# Altium footprint library SpaceVNX.PcbLib: 61 footprints (part 1 of 4)
Each footprint in its own frame and in the unit in brackets; x right, y up, seen from the top. Pads: shape width x height; smd on the part's side, far side on the other; paste and mask are expansions set on the pad; w line width, h text height; cw(c..) or ccw(c..) is an arc to the next point about the centre after c.
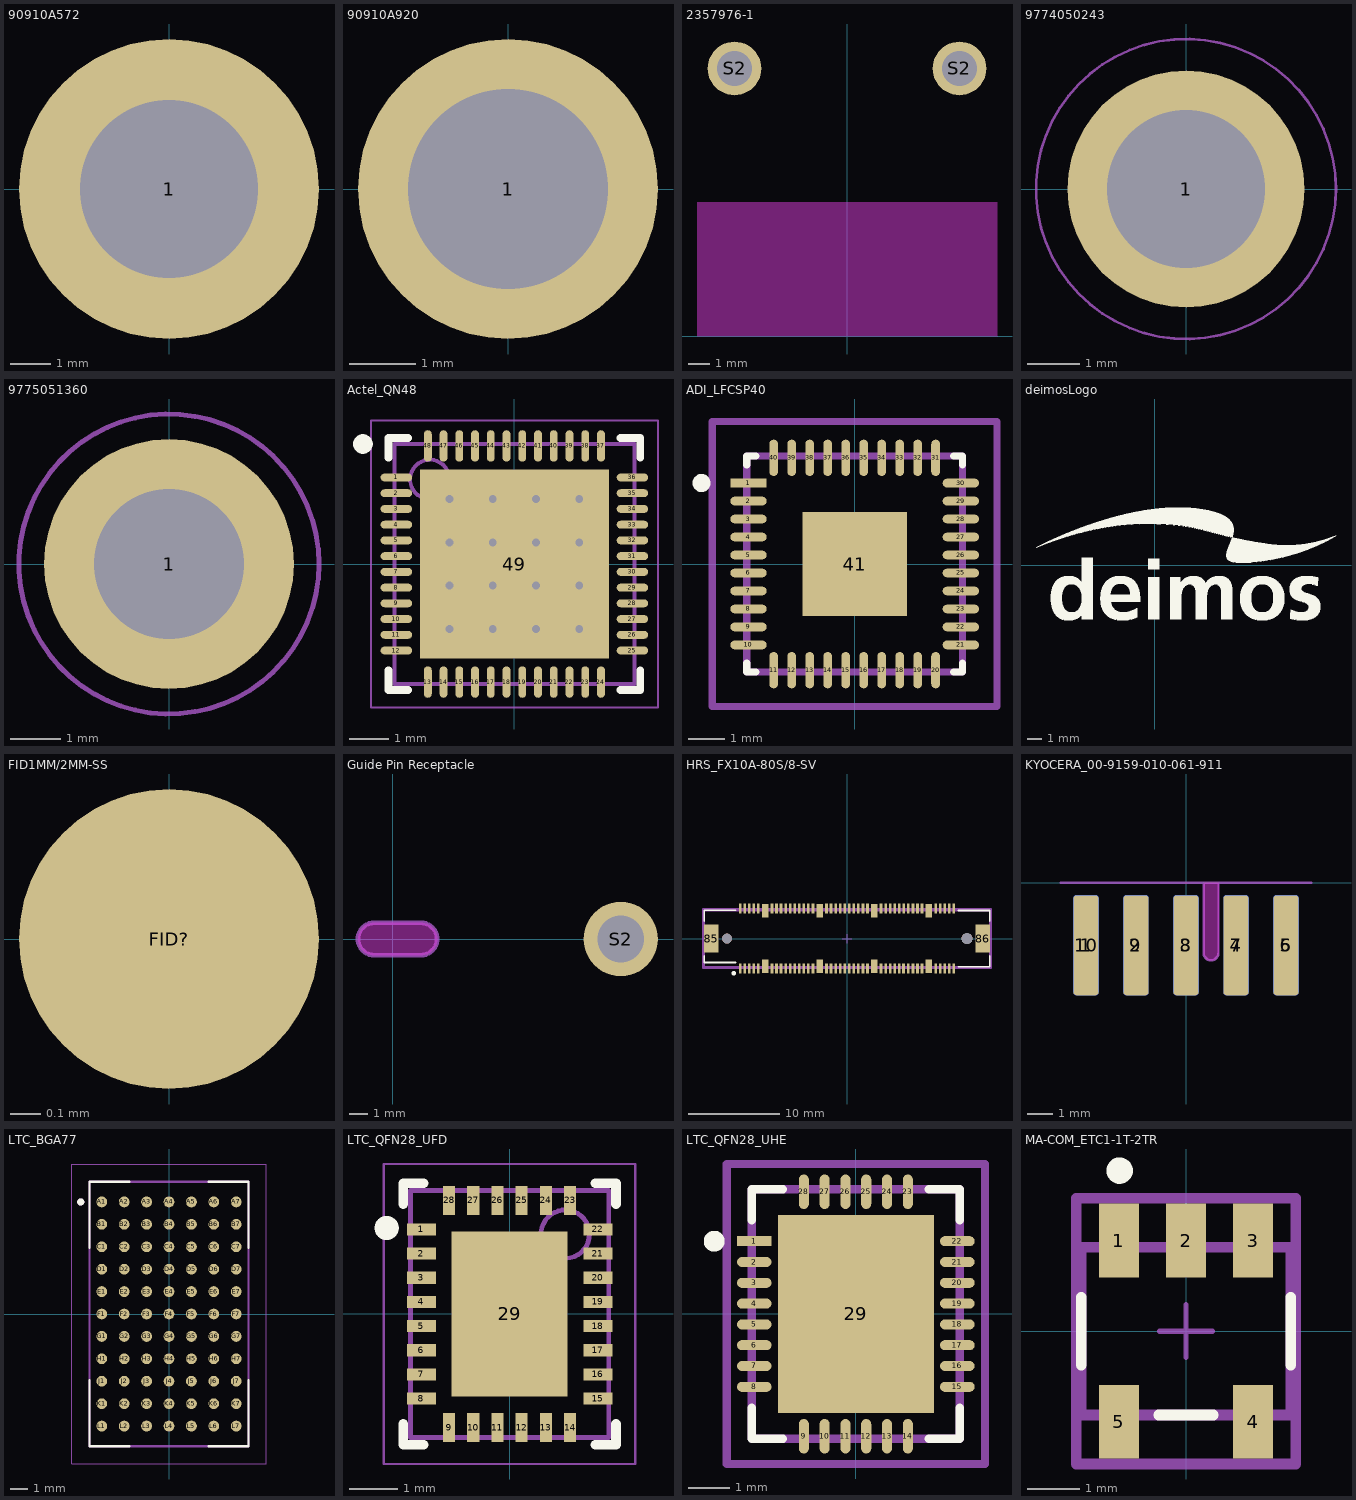
[diagram p0: the footprints below, top view; thin cyan lines are the x and y axes]

## 90910A572 [mm] "Button Head Torx Screws 18-8 Stainless Steel, M3 x 0.5 mm Thread, 4 mm Long"
height 1.65
pads (1):
  round 7.4 / inner round 0 / far side round 0 hole 4.4 unplated paste-403.566: 1(0,0)
3D body "90910A572.STEP": height 1.7, standoff -3.95, extent -2.85,-2.85 2.85,2.85

## 90910A920 [mm] "Button Head Torx Screws 18-8 Stainless Steel, M2 x 0.4mm Thread, 4mm Long"
height 1.1
pads (1):
  round 4.5 / inner round 0 / far side round 0 hole 3 unplated: 1(0,0)
3D body "90910A920.STEP": height 1.15, standoff -3.95, extent -1.9,-1.9 1.9,1.9

## 2357976-1 [mm]
pads (2):
  round 2.5 hole 1.65: S2(-5.25,12.5) S2(5.25,12.5)
Keep-Out Layer:
  board cut-out: -7,0 -7,6.25 7,6.25 7,0
3D body "c-2357976-1-a-3d.stp": height 16.36, standoff -2.54, extent -6.96,0 6.96,13.716

## 9774050243 [mm] "SMT Steel Spacer with internal Thread M2, height 5mm"
height 5
pads (1):
  round 4.5 / inner round 0 / far side round 0 hole 3 unplated: 1(0,0)
Top Paste:
  region: 0.3,2.542 0.513,2.517 0.924,2.397 1.31,2.21 1.659,1.962 1.962,1.659 2.21,1.31 2.397,0.924 2.517,0.513 2.542,0.3 1.521,0.3 1.494,0.411 1.418,0.627 1.31,0.829 1.174,1.012 1.012,1.174 0.829,1.31 0.627,1.418 0.411,1.494 0.3,1.521
  region: 2.542,-0.3 2.517,-0.513 2.397,-0.924 2.21,-1.31 1.962,-1.659 1.659,-1.962 1.31,-2.21 0.924,-2.397 0.513,-2.517 0.3,-2.542 0.3,-1.521 0.411,-1.494 0.627,-1.418 0.829,-1.31 1.012,-1.174 1.174,-1.012 1.31,-0.829 1.418,-0.627 1.494,-0.411 1.521,-0.3
  region: -0.3,-2.542 -0.513,-2.517 -0.924,-2.397 -1.31,-2.21 -1.659,-1.962 -1.962,-1.659 -2.21,-1.31 -2.397,-0.924 -2.517,-0.513 -2.542,-0.3 -1.521,-0.3 -1.494,-0.411 -1.418,-0.627 -1.31,-0.829 -1.174,-1.012 -1.012,-1.174 -0.829,-1.31 -0.627,-1.418 -0.411,-1.494 -0.3,-1.521
  region: -2.542,0.3 -2.517,0.513 -2.397,0.924 -2.21,1.31 -1.962,1.659 -1.659,1.962 -1.31,2.21 -0.924,2.397 -0.513,2.517 -0.3,2.542 -0.3,1.521 -0.411,1.494 -0.627,1.418 -0.829,1.31 -1.012,1.174 -1.174,1.012 -1.31,0.829 -1.418,0.627 -1.494,0.411 -1.521,0.3
Mechanical 11:
  circle w0.1: c0,0 r2.175
Mechanical 13:
  circle w0.1: c0,0 r2.175
Mechanical 15:
  circle w0.05: c0,0 r2.85
  lines w0.05: -0.5,0 0.5,0 ; 0,-0.5 0,0.5
3D body "9774050243.stp": height 5, standoff -1.4, extent -2.175,-2.172 2.175,2.172

## 9775051360 [mm] "SMD Steel Spacer M3 Thread Internal, Pin Length 5.1mm"
height 1
pads (1):
  round 5 / inner round 0 / far side round 0 hole 3 unplated paste-403.566: 1(0,0)
Mechanical 13:
  circle w0.1: c0,0 r3
Mechanical 15:
  lines w0.05: -0.5,0 0.5,0 ; 0,-0.5 0,0.5
3D body "9775051360.stp": height 1, standoff -5.1, extent -3,-3 3,3

## Actel_QN48 [mm] "QFN, 48-Leads, Body 6x6mm, Pitch 0.4mm, Thermal Pad 4.8x4.8mm, IPC Medium Density"
height 1
pads (49):
  oval 0.8x0.2 smd: 1(-3,2.2) 2(-3,1.8) 3(-3,1.4) 4(-3,1) 5(-3,0.6) 6(-3,0.2) 7(-3,-0.2) 8(-3,-0.6) 9(-3,-1) 10(-3,-1.4) 11(-3,-1.8) 12(-3,-2.2) 25(3,-2.2) 26(3,-1.8) 27(3,-1.4) 28(3,-1) 29(3,-0.6) 30(3,-0.2) 31(3,0.2) 32(3,0.6) 33(3,1) 34(3,1.4) 35(3,1.8) 36(3,2.2)
  oval 0.2x0.8 smd: 13(-2.2,-3) 14(-1.8,-3) 15(-1.4,-3) 16(-1,-3) 17(-0.6,-3) 18(-0.2,-3) 19(0.2,-3) 20(0.6,-3) 21(1,-3) 22(1.4,-3) 23(1.8,-3) 24(2.2,-3) 37(2.2,3) 38(1.8,3) 39(1.4,3) 40(1,3) 41(0.6,3) 42(0.2,3) 43(-0.2,3) 44(-0.6,3) 45(-1,3) 46(-1.4,3) 47(-1.8,3) 48(-2.2,3)
  rect 4.8x4.8 smd: 49(0,0)
via 1.65,-1.65 diameter 0.5 hole 0.2
via 0.55,-1.65 diameter 0.5 hole 0.2
via -0.55,-1.65 diameter 0.5 hole 0.2
via -1.65,-1.65 diameter 0.5 hole 0.2
via 1.65,-0.55 diameter 0.5 hole 0.2
via 0.55,-0.55 diameter 0.5 hole 0.2
via -0.55,-0.55 diameter 0.5 hole 0.2
via -1.65,-0.55 diameter 0.5 hole 0.2
via 1.65,0.55 diameter 0.5 hole 0.2
via 0.55,0.55 diameter 0.5 hole 0.2
via -0.55,0.55 diameter 0.5 hole 0.2
via -1.65,0.55 diameter 0.5 hole 0.2
via 1.65,1.65 diameter 0.5 hole 0.2
via 0.55,1.65 diameter 0.5 hole 0.2
via -0.55,1.65 diameter 0.5 hole 0.2
via -1.65,1.65 diameter 0.5 hole 0.2
Top Overlay:
  circle w0.25: c-3.85,3.05 r0.125
  lines w0.2: -3.2,-2.7 -3.2,-3.2 -2.7,-3.2 ; -3.2,2.7 -3.2,3.2 -2.7,3.2 ; 2.7,-3.2 3.2,-3.2 3.2,-2.7 ; 2.7,3.2 3.2,3.2 3.2,2.7
Mechanical 13:
  circle w0.1: c-2.15,2.15 r0.5
  lines w0.1: -3.05,-3.05 3.05,-3.05 3.05,3.05 -3.05,3.05 -3.05,-3.05
Mechanical 15:
  lines w0.05: -3.65,-3.65 3.65,-3.65 3.65,3.65 -3.65,3.65 -3.65,-3.65
  lines w0.1: -0.5,0 0.5,0 ; 0,-0.5 0,0.5
3D body: height 1, standoff 0, extent -3.05,-3.05 3.05,3.05

## ADI_LFCSP40 [mm] "CP-40-26, 6X6mm Body"
pads (41):
  rect 1.01x0.242 smd paste+0 mask+0: 1(-2.951,2.25)
  rrect100% 1.01x0.242 smd paste+0 mask+0: 2(-2.951,1.75) 3(-2.951,1.25) 4(-2.951,0.75) 5(-2.951,0.25) 6(-2.951,-0.25) 7(-2.951,-0.75) 8(-2.951,-1.25) 9(-2.951,-1.75) 10(-2.951,-2.25) 21(2.951,-2.25) 22(2.951,-1.75) 23(2.951,-1.25) 24(2.951,-0.75) 25(2.951,-0.25) 26(2.951,0.25) 27(2.951,0.75) 28(2.951,1.25) 29(2.951,1.75) 30(2.951,2.25)
  rrect100% 0.242x1.01 smd paste+0 mask+0: 11(-2.25,-2.951) 12(-1.75,-2.951) 13(-1.25,-2.951) 14(-0.75,-2.951) 15(-0.25,-2.951) 16(0.25,-2.951) 17(0.75,-2.951) 18(1.25,-2.951) 19(1.75,-2.951) 20(2.25,-2.951) 31(2.25,2.951) 32(1.75,2.951) 33(1.25,2.951) 34(0.75,2.951) 35(0.25,2.951) 36(-0.25,2.951) 37(-0.75,2.951) 38(-1.25,2.951) 39(-1.75,2.951) 40(-2.25,2.951)
  rect 2.9x2.9 smd paste-1000 mask+0: 41(0,0)
Top Overlay:
  circle w0.25: c-4.256,2.25 r0.125
  lines w0.2: -3,-2.75 -3,-3 -2.75,-3 ; -3,2.75 -3,3 -2.75,3 ; 2.75,-3 3,-3 3,-2.75 ; 2.75,3 3,3 3,2.75
Top Paste:
  rectangle: -0.917,-0.917 0.917,0.917
Mechanical 10:
  lines w0.2: -3.956,-3.956 3.956,-3.956 3.956,3.956 -3.956,3.956 -3.956,-3.956
  text ".Designator" at 0,0.188 h1
Mechanical 12:
  lines w0.2: -3,-3 3,-3 3,3 -3,3 -3,-3
Mechanical 15:
  lines w0.1: -0.5,0 0.5,0 ; 0,-0.5 0,0.5
  lines w0.2: -3.956,-3.956 3.956,-3.956 3.956,3.956 -3.956,3.956 -3.956,-3.956
3D body "IC_Analog_Devices_ADIN1300CCPZ_eec.STEP": height 0.25, standoff 0, extent -3.956,-3.956 3.956,3.956

## deimosLogo [mm]
Top Overlay:
  drawing of 8 lines, arcs and shapes, not listed

## FID1MM/2MM-SS [mm]
pads (1):
  round 1 smd paste-0.5 mask+0.5: FID?(0,0)

## Guide Pin Receptacle [mm] "Guide Pin Receptacle"
pads (1):
  round 4 hole 2.5: S2(12.25,0)
Keep-Out Layer:
  board cut-out: -1,-0.877 1.5,-0.877 1.615,-0.877 1.839,-0.817 2.038,-0.702 2.202,-0.538 2.317,-0.339 2.377,-0.115 2.377,0.115 2.317,0.339 2.202,0.538 2.038,0.702 1.839,0.817 1.615,0.877 1.5,0.877 -1,0.877 -1.115,0.877 -1.339,0.817 -1.538,0.702 -1.702,0.538 -1.817,0.339 -1.877,0.115 -1.877,-0.115 -1.817,-0.339 -1.702,-0.538 -1.538,-0.702 -1.339,-0.817 -1.115,-0.877
Mechanical 1:
  lines w0.254: -1,-0.877 cw(c-1,0) -1,0.877 1.5,0.877 cw(c1.5,0) 1.5,-0.877 -1,-0.877
3D body "GuidePinReceptacle.stp": height 6.94, standoff -1.3, extent 0,-2.794 14.25,2.706

## HRS_FX10A-80S/8-SV [mm] "80 Position Connector Header, Outer Shroud Contacts Surface Mount Gold"
pads (92):
  rect 0.3x1.1 smd paste-1000 mask+0: 1(-11.75,-3.302) 2(-11.75,3.302) 3(-11.25,-3.302) 4(-11.25,3.302) 5(-10.75,-3.302) 6(-10.75,3.302) 7(-10.25,-3.302) 8(-10.25,3.302) 9(-9.75,-3.302) 10(-9.75,3.302) 11(-8.25,-3.302) 12(-8.25,3.302) 13(-7.75,-3.302) 14(-7.75,3.302) 15(-7.25,-3.302) 16(-7.25,3.302) 17(-6.75,-3.302) 18(-6.75,3.302) 19(-6.25,-3.302) 20(-6.25,3.302) 21(-5.75,-3.302) 22(-5.75,3.302) 23(-5.25,-3.302) 24(-5.25,3.302) 25(-4.75,-3.302) 26(-4.75,3.302) 27(-4.25,-3.302) 28(-4.25,3.302) 29(-3.75,-3.302) 30(-3.75,3.302) 31(-2.25,-3.302) 32(-2.25,3.302) 33(-1.75,-3.302) 34(-1.75,3.302) 35(-1.25,-3.302) 36(-1.25,3.302) 37(-0.75,-3.302) 38(-0.75,3.302) 39(-0.25,-3.302) 40(-0.25,3.302) 41(0.25,-3.302) 42(0.25,3.302) 43(0.75,-3.302) 44(0.75,3.302) 45(1.25,-3.302) 46(1.25,3.302) 47(1.75,-3.302) 48(1.75,3.302) 49(2.25,-3.302) 50(2.25,3.302) 51(3.75,-3.302) 52(3.75,3.302) 53(4.25,-3.302) 54(4.25,3.302) 55(4.75,-3.302) 56(4.75,3.302) 57(5.25,-3.302) 58(5.25,3.302) 59(5.75,-3.302) 60(5.75,3.302) 61(6.223,-3.302) 62(6.25,3.302) 63(6.75,-3.302) 64(6.75,3.302) 65(7.25,-3.302) 66(7.25,3.302) 67(7.75,-3.302) 68(7.75,3.302) 69(8.25,-3.302) 70(8.25,3.302) 71(9.75,-3.302) 72(9.75,3.302) 73(10.25,-3.302) 74(10.25,3.302) 75(10.75,-3.302) 76(10.75,3.302) 77(11.25,-3.302) 78(11.25,3.302) 79(11.75,-3.302) 80(11.75,3.302)
  rect 0.7x1.5 smd paste-1000 mask+0: 81(-9,3.048) 82(-3,3.048) 83(3,3.048) 84(9,3.048) 87(-9,-3.048) 88(-3,-3.048) 89(3,-3.048) 90(9,-3.048)
  rect 1.6x3.1 smd paste+0 mask+0: 85(-14.95,0) 86(14.95,0)
  round 1.1 hole 1.1 unplated paste-1000 mask+0: ""(-13.2,0)
  round 1.2 hole 1.2 unplated paste-1000 mask+0: ""(13.2,0)
Top Overlay:
  circle w0.25: c-12.446,-3.81 r0.125
  lines w0.2: -15.7,-1.925 -15.7,-2.626 -12.229,-2.626 ; -15.7,1.925 -15.7,3.123 -12.24,3.123 ; 12.275,-3.1 15.7,-3.1 15.7,-1.925 ; 12.275,3.1 15.7,3.1 15.7,1.925
Top Paste:
  rectangle: 8.7,-3.798 9.3,-2.298
  rectangle: 2.7,-3.798 3.3,-2.298
  rectangle: -3.3,-3.798 -2.7,-2.298
  rectangle: -9.3,-3.798 -8.7,-2.298
  rectangle: 8.7,2.298 9.3,3.798
  rectangle: 2.7,2.298 3.3,3.798
  rectangle: -3.3,2.298 -2.7,3.798
  rectangle: -9.3,2.298 -8.7,3.798
  rectangle: 11.625,2.752 11.875,3.852
  rectangle: 11.125,2.752 11.375,3.852
  rectangle: 10.625,2.752 10.875,3.852
  rectangle: 10.125,2.752 10.375,3.852
  rectangle: 9.625,2.752 9.875,3.852
  rectangle: 11.625,-3.852 11.875,-2.752
  rectangle: 11.125,-3.852 11.375,-2.752
  rectangle: 10.625,-3.852 10.875,-2.752
  rectangle: 10.125,-3.852 10.375,-2.752
  rectangle: 9.625,-3.852 9.875,-2.752
  rectangle: 8.125,2.752 8.375,3.852
  rectangle: 7.625,2.752 7.875,3.852
  rectangle: 7.125,2.752 7.375,3.852
  rectangle: 6.625,2.752 6.875,3.852
  rectangle: 6.125,2.752 6.375,3.852
  rectangle: 5.625,2.752 5.875,3.852
  rectangle: 5.125,2.752 5.375,3.852
  rectangle: 4.625,2.752 4.875,3.852
  rectangle: 4.125,2.752 4.375,3.852
  rectangle: 3.625,2.752 3.875,3.852
  rectangle: 8.125,-3.852 8.375,-2.752
  rectangle: 7.625,-3.852 7.875,-2.752
  rectangle: 7.125,-3.852 7.375,-2.752
  rectangle: 6.625,-3.852 6.875,-2.752
  rectangle: 5.625,-3.852 5.875,-2.752
  rectangle: 5.125,-3.852 5.375,-2.752
  rectangle: 4.625,-3.852 4.875,-2.752
  rectangle: 4.125,-3.852 4.375,-2.752
  rectangle: 3.625,-3.852 3.875,-2.752
  rectangle: 2.125,2.752 2.375,3.852
  rectangle: 1.625,2.752 1.875,3.852
  rectangle: 1.125,2.752 1.375,3.852
  rectangle: 0.625,2.752 0.875,3.852
  rectangle: 0.125,2.752 0.375,3.852
  rectangle: -0.375,2.752 -0.125,3.852
  rectangle: -0.875,2.752 -0.625,3.852
  rectangle: -1.375,2.752 -1.125,3.852
  rectangle: -1.875,2.752 -1.625,3.852
  rectangle: -2.375,2.752 -2.125,3.852
  rectangle: 2.125,-3.852 2.375,-2.752
  rectangle: 1.625,-3.852 1.875,-2.752
  rectangle: 1.125,-3.852 1.375,-2.752
  rectangle: 0.625,-3.852 0.875,-2.752
  rectangle: 0.125,-3.852 0.375,-2.752
  rectangle: -0.375,-3.852 -0.125,-2.752
  rectangle: -0.875,-3.852 -0.625,-2.752
  rectangle: -1.375,-3.852 -1.125,-2.752
  rectangle: -1.875,-3.852 -1.625,-2.752
  rectangle: -2.375,-3.852 -2.125,-2.752
  rectangle: -3.875,2.752 -3.625,3.852
  rectangle: -4.375,2.752 -4.125,3.852
  rectangle: -4.875,2.752 -4.625,3.852
  rectangle: -5.375,2.752 -5.125,3.852
  rectangle: -5.875,2.752 -5.625,3.852
  rectangle: -6.375,2.752 -6.125,3.852
  rectangle: -6.875,2.752 -6.625,3.852
  rectangle: -7.375,2.752 -7.125,3.852
  rectangle: -7.875,2.752 -7.625,3.852
  rectangle: -8.375,2.752 -8.125,3.852
  rectangle: -3.875,-3.852 -3.625,-2.752
  rectangle: -4.375,-3.852 -4.125,-2.752
  rectangle: -4.875,-3.852 -4.625,-2.752
  rectangle: -5.375,-3.852 -5.125,-2.752
  rectangle: -5.875,-3.852 -5.625,-2.752
  rectangle: -6.375,-3.852 -6.125,-2.752
  rectangle: -6.875,-3.852 -6.625,-2.752
  rectangle: -7.375,-3.852 -7.125,-2.752
  rectangle: -7.875,-3.852 -7.625,-2.752
  rectangle: -8.375,-3.852 -8.125,-2.752
  rectangle: -9.875,2.752 -9.625,3.852
  rectangle: -10.375,2.752 -10.125,3.852
  rectangle: -10.875,2.752 -10.625,3.852
  rectangle: -11.375,2.752 -11.125,3.852
  rectangle: -11.875,2.752 -11.625,3.852
  rectangle: -9.875,-3.852 -9.625,-2.752
  rectangle: -10.375,-3.852 -10.125,-2.752
  rectangle: -10.875,-3.852 -10.625,-2.752
  rectangle: -11.375,-3.852 -11.125,-2.752
  rectangle: -11.875,-3.852 -11.625,-2.752
Mechanical 10:
  lines w0.2: -15.85,-3.25 -15.85,3.25 15.85,3.25 15.85,-3.25 -15.85,-3.25
  text ".Designator" at 0,0 h1
Mechanical 12:
  lines w0.2: -15.7,-3.1 -15.7,3.1 15.7,3.1 15.7,-3.1 -15.7,-3.1
Mechanical 15:
  lines w0.1: -0.5,0 0.5,0 ; 0,-0.5 0,0.5
  lines w0.2: -15.85,-3.25 -15.85,3.25 15.85,3.25 15.85,-3.25 -15.85,-3.25
3D body "FX10A-80S8-SV.stp": height 3.16, standoff -0.64, extent -15.561,-3.615 15.539,3.685

## KYOCERA_00-9159-010-061-911 [mm] "Coplanar Open Ended Card Edge Connector"
pads (10):
  rrect25% 1x4 smd paste+0 mask+0: 1(-4,-2.5) 2(-2,-2.5) 3(0,-2.5) 4(2,-2.5) 5(4,-2.5)
  rrect25% 1x4 smd far side paste+0 mask+0: 6(4,-2.5) 7(2,-2.5) 8(0,-2.5) 9(-2,-2.5) 10(-4,-2.5)
Keep-Out Layer:
  board cut-out: 0.7,-2.8 0.7,-2.86 0.746,-2.97 0.83,-3.054 0.94,-3.1 1.06,-3.1 1.17,-3.054 1.254,-2.97 1.3,-2.86 1.3,-2.8 1.3,0 0.7,0
Mechanical 1:
  lines w0.1: -5,0 5,0
Mechanical 2:
  lines w0.1: 0.7,-2.8 ccw(c1,-2.8) 1.3,-2.8 1.3,0 0.7,0 0.7,-2.8
3D body "AVX-00-9159-010-061-911.STEP": height 2.5, standoff -2.5, extent -4.95,-3.25 4.95,6.75

## LTC_BGA77 [mm]
pads (77):
  round 0.61 smd: A1(-3.81,6.35) A2(-2.54,6.35) A3(-1.27,6.35) A4(0,6.35) A5(1.27,6.35) A6(2.54,6.35) A7(3.81,6.35) B1(-3.81,5.08) B2(-2.54,5.08) B3(-1.27,5.08) B4(0,5.08) B5(1.27,5.08) B6(2.54,5.08) B7(3.81,5.08) C1(-3.81,3.81) C2(-2.54,3.81) C3(-1.27,3.81) C4(0,3.81) C5(1.27,3.81) C6(2.54,3.81) C7(3.81,3.81) D1(-3.81,2.54) D2(-2.54,2.54) D3(-1.27,2.54) D4(0,2.54) D5(1.27,2.54) D6(2.54,2.54) D7(3.81,2.54) E1(-3.81,1.27) E2(-2.54,1.27) E3(-1.27,1.27) E4(0,1.27) E5(1.27,1.27) E6(2.54,1.27) E7(3.81,1.27) F1(-3.81,0) F2(-2.54,0) F3(-1.27,0) F4(0,0) F5(1.27,0) F6(2.54,0) F7(3.81,0) G1(-3.81,-1.27) G2(-2.54,-1.27) G3(-1.27,-1.27) G4(0,-1.27) G5(1.27,-1.27) G6(2.54,-1.27) G7(3.81,-1.27) H1(-3.81,-2.54) H2(-2.54,-2.54) H3(-1.27,-2.54) H4(0,-2.54) H5(1.27,-2.54) H6(2.54,-2.54) H7(3.81,-2.54) J1(-3.81,-3.81) J2(-2.54,-3.81) J3(-1.27,-3.81) J4(0,-3.81) J5(1.27,-3.81) J6(2.54,-3.81) J7(3.81,-3.81) K1(-3.81,-5.08) K2(-2.54,-5.08) K3(-1.27,-5.08) K4(0,-5.08) K5(1.27,-5.08) K6(2.54,-5.08) K7(3.81,-5.08) L1(-3.81,-6.35) L2(-2.54,-6.35) L3(-1.27,-6.35) L4(0,-6.35) L5(1.27,-6.35) L6(2.54,-6.35) L7(3.81,-6.35)
Top Overlay:
  circle w0.2: c-5,6.35 r0.1
  lines w0.127: -4.5,-3.75 -4.5,-7.5 -2.25,-7.5 ; -4.5,3.75 -4.5,7.5 -2.25,7.5 ; 2.25,-7.5 4.5,-7.5 4.5,-3.75 ; 2.25,7.5 4.5,7.5 4.5,3.75
Mechanical 13:
  circle w0.2: c-5,6.35 r0.1
  lines w0.127: -4.5,-7.5 -4.5,7.5 4.5,7.5 4.5,-7.5 -4.5,-7.5
Mechanical 15:
  lines w0.05: -5.5,-8.5 -5.5,8.5 5.5,8.5 5.5,-8.5 -5.5,-8.5
3D body "BGA77.STEP": height 4.52, standoff -0.6, extent -4.5,-7.5 4.5,7.5

## LTC_QFN28_UFD [mm] "28-Lead Plastic QFN (4mm × 5mm)"
pads (29):
  rect 0.6x0.25 smd: 1(-1.825,1.75) 2(-1.825,1.25) 3(-1.825,0.75) 4(-1.825,0.25) 5(-1.825,-0.25) 6(-1.825,-0.75) 7(-1.825,-1.25) 8(-1.825,-1.75) 15(1.825,-1.75) 16(1.825,-1.25) 17(1.825,-0.75) 18(1.825,-0.25) 19(1.825,0.25) 20(1.825,0.75) 21(1.825,1.25) 22(1.825,1.75)
  rect 0.25x0.6 smd: 9(-1.25,-2.35) 10(-0.75,-2.35) 11(-0.25,-2.35) 12(0.25,-2.35) 13(0.75,-2.35) 14(1.25,-2.35) 23(1.25,2.35) 24(0.75,2.35) 25(0.25,2.35) 26(-0.25,2.35) 27(-0.75,2.35) 28(-1.25,2.35)
  rect 2.4x3.4 smd: 29(0,0)
Top Overlay:
  circle w0.25: c-2.54,1.778 r0.125
  lines w0.2: -2.2,-2.275 -2.2,-2.7 -1.775,-2.7 ; -2.2,2.275 -2.2,2.7 -1.775,2.7 ; 1.775,-2.7 2.2,-2.7 2.2,-2.275 ; 1.775,2.7 2.2,2.7 2.2,2.275
Top Courtyard:
  lines w0.05: -2.6,-3.1 -2.6,3.1 2.6,3.1 2.6,-3.1 -2.6,-3.1
  lines w0.1: -0.5,0 0.5,0 ; 0,-0.5 0,0.5
Top Assembly:
  circle w0.1: c1.15,1.65 r0.5
  lines w0.1: -2.05,-2.55 -2.05,2.55 2.05,2.55 2.05,-2.55 -2.05,-2.55
3D body "NJA0024A.stp": height 0.85, standoff 0, extent -2,-2.5 2,2.5

## LTC_QFN28_UHE [mm] "28-Lead (5mm × 6mm) Plastic QFN"
pads (29):
  rect 0.831x0.242 smd paste+0 mask+0: 1(-2.441,1.75)
  rrect100% 0.831x0.242 smd paste+0 mask+0: 2(-2.441,1.25) 3(-2.441,0.75) 4(-2.441,0.25) 5(-2.441,-0.25) 6(-2.441,-0.75) 7(-2.441,-1.25) 8(-2.441,-1.75) 15(2.441,-1.75) 16(2.441,-1.25) 17(2.441,-0.75) 18(2.441,-0.25) 19(2.441,0.25) 20(2.441,0.75) 21(2.441,1.25) 22(2.441,1.75)
  rrect100% 0.242x0.831 smd paste+0 mask+0: 9(-1.25,-2.941) 10(-0.75,-2.941) 11(-0.25,-2.941) 12(0.25,-2.941) 13(0.75,-2.941) 14(1.25,-2.941) 23(1.25,2.941) 24(0.75,2.941) 25(0.25,2.941) 26(-0.25,2.941) 27(-0.75,2.941) 28(-1.25,2.941)
  rect 3.75x4.75 smd paste-1000 mask+0: 29(0,0)
Top Overlay:
  circle w0.25: c-3.406,1.75 r0.125
  lines w0.2: -2.5,-2.25 -2.5,-3 -1.75,-3 ; -2.5,2.25 -2.5,3 -1.75,3 ; 1.75,-3 2.5,-3 2.5,-2.25 ; 1.75,3 2.5,3 2.5,2.25
Top Paste:
  rectangle: -1.289,-1.789 1.289,-0.293
  rectangle: -1.289,0.293 1.289,1.789
Mechanical 10:
  lines w0.2: -3.106,-3.606 -3.106,3.606 3.106,3.606 3.106,-3.606 -3.106,-3.606
  text ".Designator" at 0,0.188 h1
Mechanical 12:
  lines w0.2: -2.5,-3 -2.5,3 2.5,3 2.5,-3 -2.5,-3
Mechanical 15:
  lines w0.1: -0.5,0 0.5,0 ; 0,-0.5 0,0.5
  lines w0.2: -3.106,-3.606 -3.106,3.606 3.106,3.606 3.106,-3.606 -3.106,-3.606
3D body "IC_Analog_Devices_LTC2937CUHE#PBF_eec.STEP": height 0.25, standoff 0, extent -3.106,-3.606 3.106,3.606

## MA-COM_ETC1-1T-2TR [mm]
pads (5):
  rect 0.76x1.4 smd paste+0 mask+0: 1(-1.27,1.715) 2(0,1.715) 3(1.27,1.715) 4(1.27,-1.715) 5(-1.27,-1.715)
Top Overlay:
  circle w0.25: c-1.256,3.04 r0.125
  lines w0.2: -1.981,-0.64 -1.981,0.64 ; -0.515,-1.587 0.515,-1.587 ; 1.981,-0.64 1.981,0.64
Mechanical 10:
  lines w0.2: -2.081,-2.515 2.081,-2.515 2.081,2.515 -2.081,2.515 -2.081,-2.515
  text ".Designator" at 0,0 h1
Mechanical 12:
  lines w0.2: -1.981,-1.587 1.981,-1.587 1.981,1.587 -1.981,1.587 -1.981,-1.587
Mechanical 15:
  lines w0.1: -0.5,0 0.5,0 ; 0,-0.5 0,0.5
  lines w0.2: -2.081,-2.515 2.081,-2.515 2.081,2.515 -2.081,2.515 -2.081,-2.515
3D body "Trans_MA-COM_ETC1-1T-2TR_eec.STEP": height 0.25, standoff 0, extent -2.081,-2.515 2.081,2.515